# Altium footprint library Hare_Library.PcbLib: 252 footprints (part 2 of 16)
Each footprint in its own frame and in the unit in brackets; x right, y up, seen from the top. Pads: shape width x height; smd on the part's side, far side on the other; paste and mask are expansions set on the pad; w line width, h text height; cw(c..) or ccw(c..) is an arc to the next point about the centre after c.
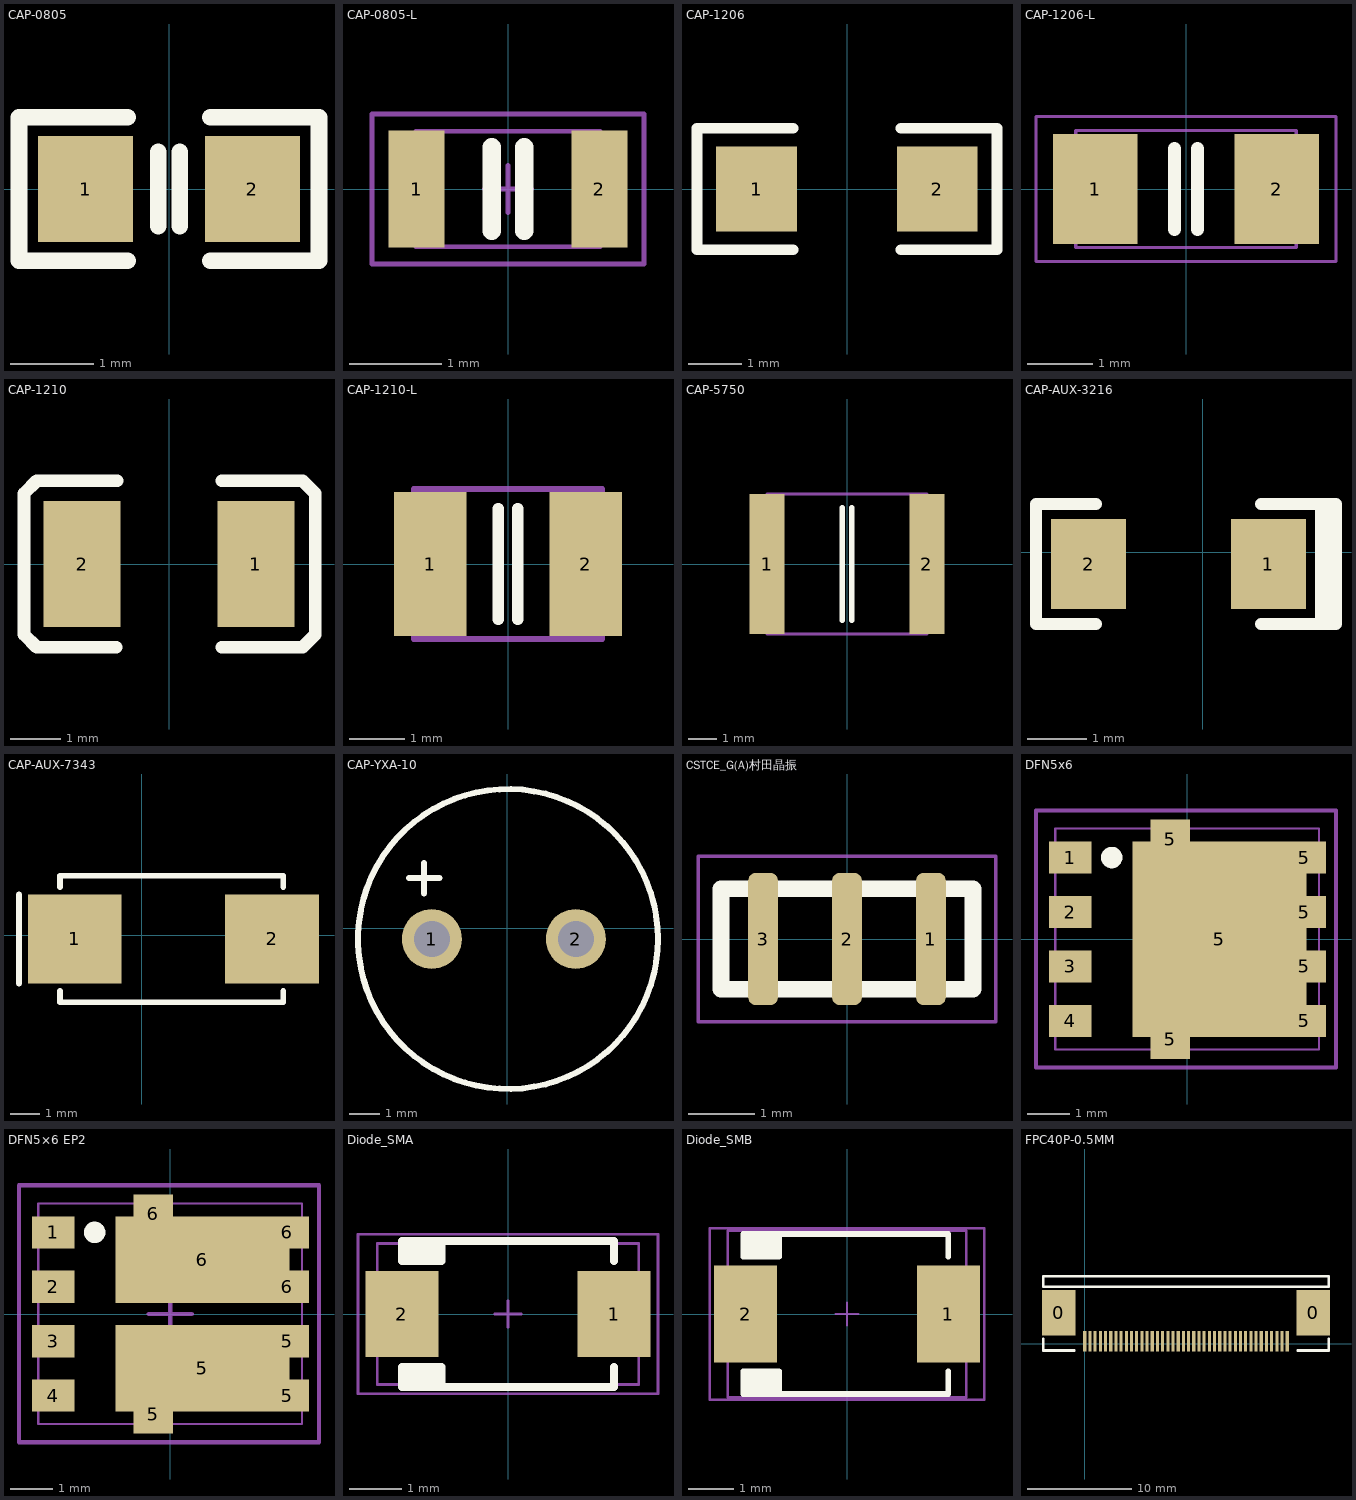
[diagram p1: the footprints below, top view; thin cyan lines are the x and y axes]

## CAP-0805 [mm]
pads (2):
  rect 1.14x1.27 smd: 1(-1.003,0) 2(1.003,0)
Top Overlay:
  lines w0.2: -0.495,-0.864 -1.803,-0.864 -1.803,0.864 -0.495,0.864 ; -0.13,-0.45 -0.13,0.45 ; 0.13,-0.45 0.13,0.45 ; 0.495,-0.864 1.803,-0.864 1.803,0.864 0.495,0.864
3D body "C_0805.STEP": height 1.01, standoff -0.01, extent -1.016,-0.645 1.016,0.645

## CAP-0805-L [mil]
height 47.24
pads (2):
  rect 24x50 smd: 1(-39,0) 2(39,0)
Top Overlay:
  lines w7.87: -6.89,-17.72 -6.89,17.72 ; 6.89,-17.72 6.89,17.72
Mechanical 13:
  lines w2: -10,0 10,0 ; 0,-10 0,10 ; -39.37,-24.61 -39.37,24.61 39.37,24.61 39.37,-24.61 -39.37,-24.61
Mechanical 14:
  lines w2: -58,-32 -58,32 58,32 58,-32 -58,-32
3D body "CAPC2012X10L.step": height 39.37, standoff 0, extent -39.37,-24.6 39.37,24.61

## CAP-1206 [mm] "贴片元件"
height 1.5
pads (2):
  rect 1.524x1.6 smd: 1(-1.703,0) 2(1.7,0)
Top Overlay:
  lines w0.2: -1.016,-1.143 -2.825,-1.143 -2.825,1.143 -2.373,1.143 -1.468,1.143 -1.016,1.143 ; 1.016,-1.143 2.825,-1.143 2.825,1.143 1.016,1.143
3D body: height 1, standoff 0, extent -1.905,-0.889 -1.397,0.889
3D body: height 1, standoff 0, extent 1.397,-0.889 1.905,0.889
3D body: height 1, standoff 0, extent -1.397,-0.889 1.397,0.889

## CAP-1206-L [mm] "Chip Capacitor, 2-Leads, Body 3.20x1.60mm, IPC Medium Density"
height 1.23
pads (2):
  rect 1.3x1.7 smd: 1(-1.4,0) 2(1.4,0)
Top Overlay:
  lines w0.2: -0.175,-0.625 -0.175,0.625 ; 0.175,-0.625 0.175,0.625
Mechanical 13:
  lines w0.051: -1.7,-0.9 1.7,-0.9 1.7,0.9 -1.7,0.9 -1.7,-0.9
Mechanical 14:
  lines w0.051: -2.311,-1.118 2.311,-1.118 2.311,1.118 -2.311,1.118 -2.311,-1.118
3D body "1206-CAP.step": height 0.5, standoff 0, extent -1.7,-0.9 1.7,0.9

## CAP-1210 [mm] "贴片电容"
height 3
pads (2):
  rect 1.52x2.5 smd: 1(1.725,0) 2(-1.725,0)
Top Overlay:
  lines w0.254: -1.05,-1.651 -2.621,-1.651 -2.875,-1.397 -2.875,1.397 -2.621,1.651 -1.025,1.651 ; 1.05,-1.651 2.646,-1.651 2.9,-1.397 2.9,1.397 2.646,1.651 1.05,1.651
3D body: height 1, standoff 0, extent -1.676,-1.27 1.626,1.27

## CAP-1210-L [mm] "Chip Capacitor, 2-Leads, Body 3.20x2.50mm, IPC Medium Density"
height 1.5
pads (2):
  rect 1.3x2.6 smd: 1(-1.4,0) 2(1.4,0)
Top Overlay:
  lines w0.2: -0.175,-1 -0.175,1 ; 0.175,-1 0.175,1
Mechanical 13:
  lines w0.1: -1.7,-1.35 -1.7,1.35 1.7,1.35 1.7,-1.35 -1.7,-1.35
3D body "1210-CAP.step": height 1.5, standoff 0, extent -1.7,-1.35 1.7,1.35

## CAP-5750 [mm]
pads (2):
  rect 1.25x5 smd mask+0: 1(-2.85,0) 2(2.85,0)
Top Overlay:
  lines w0.2: -0.175,-2 -0.175,2 ; 0.175,-2 0.175,2
Mechanical 14:
  lines w0.1: -2.85,-2.5 -2.85,2.5 2.85,2.5 2.85,-2.5 -2.85,-2.5
3D body "CAP-2220.stp": height 2.74, standoff 0.04, extent -3.076,-2.718 3.024,2.682

## CAP-AUX-3216 [mil] "钽电容1206大小"
pads (2):
  rect 50x60 smd: 1(44,-8) 2(-76,-8)
Top Overlay:
  lines w7.87: -111,-48 -71,-48 ; -111,32 -71,32 ; 39,-48 89,-48 ; 39,32 89,32
  lines w8: -111,-48 -111,32 ; 79,-48 79,32 ; 84,-48 84,32 ; 89,-48 89,32
3D body "User Library-CAP_TANT_3216-18_A_case-1.SLDPRT": height 66.93, standoff 0, extent -81.93,-45 51.93,25.87

## CAP-AUX-7343 [mm] "贴片7343钽电容"
pads (2):
  rect 3.2x3.05 smd: 1(-2.286,-0.127) 2(4.445,-0.127)
Top Overlay:
  lines w0.2: -4.191,-1.651 -4.191,1.397 ; -2.794,-1.905 -2.794,-2.286 4.826,-2.286 4.826,-1.905 ; -2.794,1.651 -2.794,2.032 4.826,2.032 4.826,1.651
3D body "User Library-AVX_E_CASE.SLDPRT": height 4.2, standoff 0, extent -2.684,-2.352 4.716,2.098

## CAP-YXA-10 [mm]
pads (2):
  round 2 hole 1.2: 1(-2.515,-0.356) 2(2.285,-0.356)
Top Overlay:
  circle w0.2: c0.025,-0.356 r5
  lines w0.2: -3.277,1.676 -2.261,1.676 ; -2.769,1.168 -2.769,2.184

## CSTCE_G(A)村田晶振 [mm]
pads (3):
  rrect50% 0.45x2 smd: 1(1.27,0) 2(0,0) 3(-1.27,0)
Top Overlay:
  lines w0.254: -1.905,-0.762 -1.905,0.762 1.905,0.762 1.905,-0.762 -1.905,-0.762
Mechanical 13:
  lines w0.051: -0.127,0 0.127,0 ; 0,-0.127 0,0.127 ; -1.9,-0.8 -1.9,0.8 1.9,0.8 1.9,-0.8 -1.9,-0.8
Mechanical 14:
  lines w0.051: -2.25,-1.25 -2.25,1.25 2.25,1.25 2.25,-1.25 -2.25,-1.25
3D body: height 1, standoff 0, extent -1.9,-0.8 1.9,0.8

## DFN5x6 [mm]
pads (11):
  rect 1x0.75 smd: 1(-2.73,1.905) 2(-2.73,0.635) 3(-2.73,-0.635) 4(-2.73,-1.905) 5(2.73,-1.905) 5(2.73,-0.635) 5(2.73,0.635) 5(2.73,1.905)
  rect 0.92x0.905 smd: 5(-0.394,-2.337) 5(-0.394,2.337)
  rect 4.055x4.56 smd: 5(0.749,0)
Top Overlay:
  circle w0.25: c-1.765,1.905 r0.125
Mechanical 13:
  lines w0.051: -0.254,0 0.254,0 ; 0,-0.254 0,0.254 ; -3.08,-2.57 -3.08,2.58 3.07,2.58 3.07,-2.57 -3.08,-2.57
Mechanical 14:
  lines w0.1: -3.531,-2.995 3.47,-2.995 3.47,3.005 -3.531,3.005 -3.531,-2.995
Mechanical 15:
  lines w0.1: -0.5,0 0.5,0 ; 0,-0.5 0,0.5
3D body "DFN5x6_SO8FL.STEP": height 1.12, standoff -0.01, extent -3.08,-2.57 3.07,2.58

## DFN5×6 EP2 [mm]
pads (12):
  rect 1x0.75 smd: 1(-2.73,1.905) 2(-2.73,0.635) 3(-2.73,-0.635) 4(-2.73,-1.905) 5(2.73,-1.905) 5(2.73,-0.635) 6(2.73,0.635) 6(2.73,1.905)
  rect 0.92x0.905 smd: 5(-0.394,-2.337) 6(-0.394,2.337)
  rect 4.055x2.02 smd: 5(0.749,-1.27) 6(0.749,1.27)
Top Overlay:
  circle w0.25: c-1.765,1.905 r0.125
Mechanical 13:
  lines w0.051: -0.254,0 0.254,0 ; 0,-0.254 0,0.254 ; -3.08,-2.57 3.07,-2.57 3.07,2.58 -3.08,2.58 -3.08,-2.57
Mechanical 14:
  lines w0.1: -3.531,-2.995 -3.531,3.005 3.47,3.005 3.47,-2.995 -3.531,-2.995
Mechanical 15:
  lines w0.1: -0.5,0 0.5,0 ; 0,-0.5 0,0.5
3D body "DFN5x6_SO8FL.STEP": height 1.12, standoff -0.01, extent -3.08,-2.57 3.07,2.58

## Diode_SMA [mil]
pads (2):
  rect 55x65 smd: 1(79.98,0) 2(-80.02,0)
Top Overlay:
  region: -50.02,40 -50.02,55 -80.02,55 -80.02,40
  region: -50.02,-40 -50.02,-55 -80.02,-55 -80.02,-40
  lines w6: -50.02,-55 -50.02,-40 -80.02,-40 -80.02,-55 79.98,-55 79.98,-40 ; -50.02,55 -50.02,40 -80.02,40 -80.02,55 79.98,55 79.98,40
Mechanical 13:
  lines w2: -10.01,0.01 9.99,0.01 ; -0.01,-9.99 -0.01,10.01 ; -98.43,-53.14 98.42,-53.14 98.42,53.16 -98.43,53.16 -98.43,-53.14
Mechanical 14:
  lines w2: -113.02,-60 -113.02,60 112.98,60 112.98,-60 -113.02,-60
3D body "User Library-DO-214AC_SMA.STEP": height 84.69, standoff -1.97, extent -98.43,-53.14 98.42,53.16

## Diode_SMB [mil]
pads (2):
  rect 55x85 smd: 1(88.58,0) 2(-88.58,0)
Top Overlay:
  region: -59.5,50 -59.5,70 -90.58,70 -90.58,50
  region: -59.5,-50 -59.5,-70 -90.58,-70 -90.58,-50
  lines w5: -59.5,-70 -59.5,-50 -90.58,-50 -90.58,-70 88.58,-70 88.58,-50 ; -59.5,70 -59.5,50 -90.58,50 -90.58,70 88.58,70 88.58,50
Mechanical 13:
  lines w2: -10,0 10,0 ; 0,-10 0,10 ; -104.33,-72.84 -104.33,72.84 104.33,72.84 104.33,-72.84 -104.33,-72.84
Mechanical 14:
  lines w2: -120,-75 120,-75 120,75 -120,75 -120,-75
3D body "User Library-DO-214AA_SMB.STEP": height 86.65, standoff -1.97, extent -104.33,-72.84 104.33,72.84

## FPC40P-0.5MM [mm]
height 1.6
pads (42):
  rect 3.2x4.4 smd: 0(-2.5,3) 0(22,3)
  rect 0.3x2 smd: 1(19.5,0.254) 2(19,0.254) 3(18.5,0.254) 4(18,0.254) 5(17.5,0.254) 6(17,0.254) 7(16.5,0.254) 8(16,0.254) 9(15.5,0.254) 10(15,0.254) 11(14.5,0.254) 12(14,0.254) 13(13.5,0.254) 14(13,0.254) 15(12.5,0.254) 16(12,0.254) 17(11.5,0.254) 18(11,0.254) 19(10.5,0.254) 20(10,0.254) 21(9.5,0.254) 22(9,0.254) 23(8.5,0.254) 24(8,0.254) 25(7.5,0.254) 26(7,0.254) 27(6.5,0.254) 28(6,0.254) 29(5.5,0.254) 30(5,0.254) 31(4.5,0.254) 32(4,0.254) 33(3.5,0.254) 34(3,0.254) 35(2.5,0.254) 36(2,0.254) 37(1.5,0.254) 38(1,0.254) 39(0.5,0.254) 40(0,0.254)
Top Overlay:
  lines w0.254: -4,0.5 -4,-0.635 -1.016,-0.635 ; 20.5,-0.635 23.5,-0.635 23.5,0.5 ; -4,5.5 -4,6.5 23.5,6.5 23.5,5.5 -4,5.5